# Altium footprint library Standard.PcbLib: 149 footprints (part 6 of 10)
Each footprint in its own frame and in the unit in brackets; x right, y up, seen from the top. Pads: shape width x height; smd on the part's side, far side on the other; paste and mask are expansions set on the pad; w line width, h text height; cw(c..) or ccw(c..) is an arc to the next point about the centre after c.
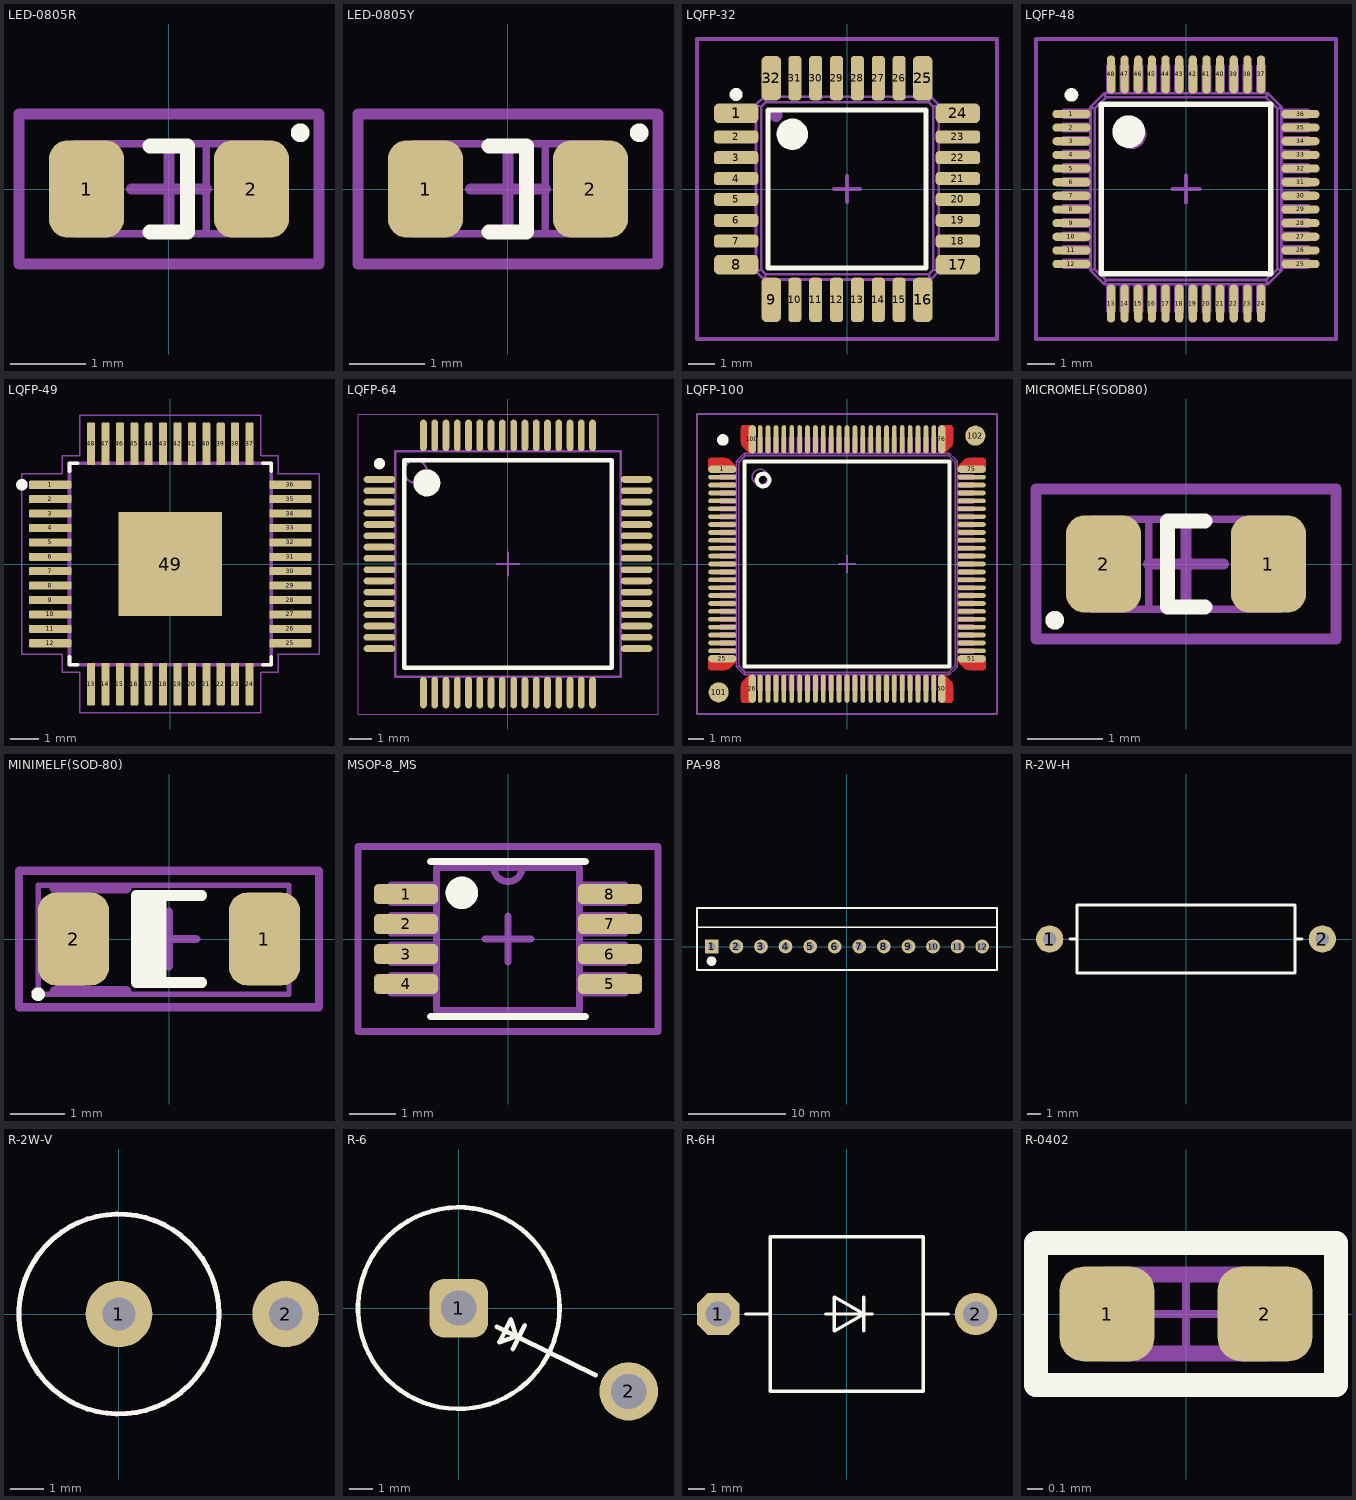
[diagram p5: the footprints below, top view; thin cyan lines are the x and y axes]

## LED-0805R [mm] "Chip Led, 2-Leads, Body 2,00x1,25mm, IPC Medium Density"
height 0.7
pads (2):
  rrect50% 1x1.3 smd: 1(-1.1,0) 2(1.1,0)
Top Overlay:
  circle w0.15: c1.75,0.75 r0.05
  lines w0.2: -0.25,-0.575 0.25,-0.575 0.25,0.575 -0.25,0.575
Top Assembly:
  lines w0.1: 0.5,-0.6 0.5,0.6 ; 0.75,-0.6 0.75,0.6 ; -1.25,-0.6 1.25,-0.6 1.25,0.6 -1.25,0.6 -1.25,-0.6
Top Component Outline:
  lines w0.15: -0.5,0 0.5,0 ; 0,-0.5 0,0.5 ; -2,-1 2,-1 2,1 -2,1 -2,-1
3D body "User Library-led_0805R.STEP": height 1.1, standoff 0, extent -1.01,-0.625 1.01,0.625

## LED-0805Y [mm] "Chip Led, 2-Leads, Body 2,00x1,25mm, IPC Medium Density"
height 0.7
pads (2):
  rrect50% 1x1.3 smd: 1(-1.1,0) 2(1.1,0)
Top Overlay:
  circle w0.15: c1.75,0.75 r0.05
  lines w0.2: -0.25,-0.575 0.25,-0.575 0.25,0.575 -0.25,0.575
Top Assembly:
  lines w0.1: 0.5,-0.6 0.5,0.6 ; 0.75,-0.6 0.75,0.6 ; -1.25,-0.6 1.25,-0.6 1.25,0.6 -1.25,0.6 -1.25,-0.6
Top Component Outline:
  lines w0.15: -0.5,0 0.5,0 ; 0,-0.5 0,0.5 ; -2,-1 2,-1 2,1 -2,1 -2,-1
3D body "User Library-led_0805Y.STEP": height 1.1, standoff 0, extent -1.01,-0.625 1.01,0.625

## LQFP-32 [mm] "LQFP, 32-Leads, Body 7,00x7,00mm, Pitch 0,80mm, IPC Medium Density"
height 1.2
pads (32):
  rrect50% 1.7x0.75 smd: 1(-4.25,2.9) 8(-4.25,-2.9) 17(4.25,-2.9) 24(4.25,2.9)
  rrect50% 1.7x0.5 smd: 2(-4.25,2) 3(-4.25,1.2) 4(-4.25,0.4) 5(-4.25,-0.4) 6(-4.25,-1.2) 7(-4.25,-2) 18(4.25,-2) 19(4.25,-1.2) 20(4.25,-0.4) 21(4.25,0.4) 22(4.25,1.2) 23(4.25,2)
  rrect50% 0.75x1.7 smd: 9(-2.9,-4.25) 16(2.9,-4.25) 25(2.9,4.25) 32(-2.9,4.25)
  rrect50% 0.5x1.7 smd: 10(-2,-4.25) 11(-1.2,-4.25) 12(-0.4,-4.25) 13(0.4,-4.25) 14(1.2,-4.25) 15(2,-4.25) 26(2,4.25) 27(1.2,4.25) 28(0.4,4.25) 29(-0.4,4.25) 30(-1.2,4.25) 31(-2,4.25)
Top Overlay:
  circle w0.6: c-2.1,2.1 r0.3
  circle w0.25: c-4.25,3.625 r0.125
  lines w0.2: -3.025,-3.025 -3.025,3.025 3.025,3.025 3.025,-3.025 -3.025,-3.025
Top Assembly:
  drawing of 313 lines, arcs and shapes, not listed
Top Component Outline:
  lines w0.15: -0.5,0 0.5,0 ; 0,-0.5 0,0.5 ; -5.75,-5.75 -5.75,5.75 5.75,5.75 5.75,-5.75 -5.75,-5.75
3D body "User Library-lqfp32-1.step": height 1.5, standoff 0.02, extent -4.5,-4.5 4.5,4.5

## LQFP-48 [mm] "SQFP, 48-Leads, Body 7,00x7,00mm, Pitch 0,50mm, IPC Medium Density"
height 1.8
pads (48):
  oval 1.4x0.3 smd: 1(-4.2,2.75) 2(-4.2,2.25) 3(-4.2,1.75) 4(-4.2,1.25) 5(-4.2,0.75) 6(-4.2,0.25) 7(-4.2,-0.25) 8(-4.2,-0.75) 9(-4.2,-1.25) 10(-4.2,-1.75) 11(-4.2,-2.25) 12(-4.2,-2.75) 25(4.2,-2.75) 26(4.2,-2.25) 27(4.2,-1.75) 28(4.2,-1.25) 29(4.2,-0.75) 30(4.2,-0.25) 31(4.2,0.25) 32(4.2,0.75) 33(4.2,1.25) 34(4.2,1.75) 35(4.2,2.25) 36(4.2,2.75)
  oval 0.3x1.4 smd: 13(-2.75,-4.2) 14(-2.25,-4.2) 15(-1.75,-4.2) 16(-1.25,-4.2) 17(-0.75,-4.2) 18(-0.25,-4.2) 19(0.25,-4.2) 20(0.75,-4.2) 21(1.25,-4.2) 22(1.75,-4.2) 23(2.25,-4.2) 24(2.75,-4.2) 37(2.75,4.2) 38(2.25,4.2) 39(1.75,4.2) 40(1.25,4.2) 41(0.75,4.2) 42(0.25,4.2) 43(-0.25,4.2) 44(-0.75,4.2) 45(-1.25,4.2) 46(-1.75,4.2) 47(-2.25,4.2) 48(-2.75,4.2)
Top Overlay:
  circle w0.6: c-2.1,2.1 r0.3
  circle w0.25: c-4.2,3.45 r0.125
  lines w0.2: -3.1,-3.1 3.1,-3.1 3.1,3.1 -3.1,3.1 -3.1,-3.1
Top Assembly:
  drawing of 1945 lines, arcs and shapes, not listed
Top Component Outline:
  lines w0.15: -0.5,0 0.5,0 ; 0,-0.5 0,0.5 ; -5.5,-5.5 -5.5,5.5 5.5,5.5 5.5,-5.5 -5.5,-5.5
3D body "User Library-LQFP48_Grid_0_5.STEP": height 1.6, standoff 0, extent -4.5,-4.5 4.5,4.5

## LQFP-49 [mm]
pads (49):
  rrect25% 1.47x0.28 smd: 1(-4.17,2.75) 2(-4.17,2.25) 3(-4.17,1.75) 4(-4.17,1.25) 5(-4.17,0.75) 6(-4.17,0.25) 7(-4.17,-0.25) 8(-4.17,-0.75) 9(-4.17,-1.25) 10(-4.17,-1.75) 11(-4.17,-2.25) 12(-4.17,-2.75) 25(4.17,-2.75) 26(4.17,-2.25) 27(4.17,-1.75) 28(4.17,-1.25) 29(4.17,-0.75) 30(4.17,-0.25) 31(4.17,0.25) 32(4.17,0.75) 33(4.17,1.25) 34(4.17,1.75) 35(4.17,2.25) 36(4.17,2.75)
  rrect25% 0.28x1.47 smd: 13(-2.75,-4.17) 14(-2.25,-4.17) 15(-1.75,-4.17) 16(-1.25,-4.17) 17(-0.75,-4.17) 18(-0.25,-4.17) 19(0.25,-4.17) 20(0.75,-4.17) 21(1.25,-4.17) 22(1.75,-4.17) 23(2.25,-4.17) 24(2.75,-4.17) 37(2.75,4.17) 38(2.25,4.17) 39(1.75,4.17) 40(1.25,4.17) 41(0.75,4.17) 42(0.25,4.17) 43(-0.25,4.17) 44(-0.75,4.17) 45(-1.25,4.17) 46(-1.75,4.17) 47(-2.25,4.17) 48(-2.75,4.17)
  rect 3.6x3.6 smd paste-3: 49(0,0)
Top Overlay:
  circle w0.2: c-5.152,2.75 r0.1
  lines w0.127: -3.5,-3.215 -3.5,-3.5 -3.215,-3.5 ; -3.5,3.215 -3.5,3.5 -3.215,3.5 ; 3.215,-3.5 3.5,-3.5 3.5,-3.215 ; 3.215,3.5 3.5,3.5 3.5,3.215
Top Paste:
  region: 1.445,-1.446 0.175,-1.446 0.175,-0.175 1.445,-0.175
  region: 1.445,0.175 0.175,0.175 0.175,1.445 1.445,1.445
  region: -0.175,0.175 -1.447,0.175 -1.447,1.445 -0.175,1.445
  region: -0.175,-1.447 -1.447,-1.447 -1.447,-0.175 -0.175,-0.175
Top Assembly:
  lines w0.127: -3.5,-3.5 3.5,-3.5 3.5,3.5 -3.5,3.5 -3.5,-3.5
Top Component Outline:
  lines w0.05: -5.16,-3.14 -5.16,3.14 -3.75,3.14 -3.75,3.75 -3.14,3.75 -3.14,5.16 3.14,5.16 3.14,3.75 3.75,3.75 3.75,3.14 5.16,3.14 5.16,-3.14 3.75,-3.14 3.75,-3.75 3.14,-3.75 3.14,-5.16 -3.14,-5.16 -3.14,-3.75 -3.75,-3.75 -3.75,-3.14 -5.16,-3.14
3D body "User Library-LQFP48_Grid_0_5.STEP": height 1.6, standoff 0, extent -4.5,-4.5 4.5,4.5

## LQFP-64 [mm] "SQFP, 64-Leads, Body 10,00x10,00mm, Pitch 0,50mm, IPC Medium Density"
height 2.45
pads (64):
  oval 1.4x0.3 smd: 1(-5.7,3.75) 2(-5.7,3.25) 3(-5.7,2.75) 4(-5.7,2.25) 5(-5.7,1.75) 6(-5.7,1.25) 7(-5.7,0.75) 8(-5.7,0.25) 9(-5.7,-0.25) 10(-5.7,-0.75) 11(-5.7,-1.25) 12(-5.7,-1.75) 13(-5.7,-2.25) 14(-5.7,-2.75) 15(-5.7,-3.25) 16(-5.7,-3.75) 33(5.7,-3.75) 34(5.7,-3.25) 35(5.7,-2.75) 36(5.7,-2.25) 37(5.7,-1.75) 38(5.7,-1.25) 39(5.7,-0.75) 40(5.7,-0.25) 41(5.7,0.25) 42(5.7,0.75) 43(5.7,1.25) 44(5.7,1.75) 45(5.7,2.25) 46(5.7,2.75) 47(5.7,3.25) 48(5.7,3.75)
  oval 0.3x1.4 smd: 17(-3.75,-5.7) 18(-3.25,-5.7) 19(-2.75,-5.7) 20(-2.25,-5.7) 21(-1.75,-5.7) 22(-1.25,-5.7) 23(-0.75,-5.7) 24(-0.25,-5.7) 25(0.25,-5.7) 26(0.75,-5.7) 27(1.25,-5.7) 28(1.75,-5.7) 29(2.25,-5.7) 30(2.75,-5.7) 31(3.25,-5.7) 32(3.75,-5.7) 49(3.75,5.7) 50(3.25,5.7) 51(2.75,5.7) 52(2.25,5.7) 53(1.75,5.7) 54(1.25,5.7) 55(0.75,5.7) 56(0.25,5.7) 57(-0.25,5.7) 58(-0.75,5.7) 59(-1.25,5.7) 60(-1.75,5.7) 61(-2.25,5.7) 62(-2.75,5.7) 63(-3.25,5.7) 64(-3.75,5.7)
Top Overlay:
  circle w0.6: c-3.6,3.6 r0.3
  circle w0.25: c-5.7,4.45 r0.125
  lines w0.2: -4.6,-4.6 4.6,-4.6 4.6,4.6 -4.6,4.6 -4.6,-4.6
Top Assembly:
  circle w0.1: c-4.1,4.1 r0.5
  lines w0.1: -5,-5 5,-5 5,5 -5,5 -5,-5
Top Component Outline:
  lines w0.05: -6.65,-6.65 6.65,-6.65 6.65,6.65 -6.65,6.65 -6.65,-6.65
  lines w0.1: -0.5,0 0.5,0 ; 0,-0.5 0,0.5
3D body "SQFP50P1200X1200X245-64N.step": height 2.45, standoff 0, extent -6,-6 6,6

## LQFP-100 [mm]
pads (110):
  oval 1.78x0.5 smd: 1(-7.9,6) 25(-7.9,-6) 51(7.9,-6) 75(7.9,6)
  round 0 smd paste-25.4 mask-25.4: 1(-7.9,6) 25(-7.9,-6) 26(-6,-7.9) 50(6,-7.9) 51(7.9,-6) 75(7.9,6) 76(6,7.9) 100(-6,7.9)
  oval 1.78x0.3 smd: 2(-7.9,5.5) 3(-7.9,5) 4(-7.9,4.5) 5(-7.9,4) 6(-7.9,3.5) 7(-7.9,3) 8(-7.9,2.5) 9(-7.9,2) 10(-7.9,1.5) 11(-7.9,1) 12(-7.9,0.5) 13(-7.9,0) 14(-7.9,-0.5) 15(-7.9,-1) 16(-7.9,-1.5) 17(-7.9,-2) 18(-7.9,-2.5) 19(-7.9,-3) 20(-7.9,-3.5) 21(-7.9,-4) 22(-7.9,-4.5) 23(-7.9,-5) 24(-7.9,-5.5) 52(7.9,-5.5) 53(7.9,-5) 54(7.9,-4.5) 55(7.9,-4) 56(7.9,-3.5) 57(7.9,-3) 58(7.9,-2.5) 59(7.9,-2) 60(7.9,-1.5) 61(7.9,-1) 62(7.9,-0.5) 63(7.9,0) 64(7.9,0.5) 65(7.9,1) 66(7.9,1.5) 67(7.9,2) 68(7.9,2.5) 69(7.9,3) 70(7.9,3.5) 71(7.9,4) 72(7.9,4.5) 73(7.9,5) 74(7.9,5.5)
  oval 0.5x1.78 smd: 26(-6,-7.9) 50(6,-7.9) 76(6,7.9) 100(-6,7.9)
  oval 0.3x1.78 smd: 27(-5.5,-7.9) 28(-5,-7.9) 29(-4.5,-7.9) 30(-4,-7.9) 31(-3.5,-7.9) 32(-3,-7.9) 33(-2.5,-7.9) 34(-2,-7.9) 35(-1.5,-7.9) 36(-1,-7.9) 37(-0.5,-7.9) 38(0,-7.9) 39(0.5,-7.9) 40(1,-7.9) 41(1.5,-7.9) 42(2,-7.9) 43(2.5,-7.9) 44(3,-7.9) 45(3.5,-7.9) 46(4,-7.9) 47(4.5,-7.9) 48(5,-7.9) 49(5.5,-7.9) 77(5.5,7.9) 78(5,7.9) 79(4.5,7.9) 80(4,7.9) 81(3.5,7.9) 82(3,7.9) 83(2.5,7.9) 84(2,7.9) 85(1.5,7.9) 86(1,7.9) 87(0.5,7.9) 88(0,7.9) 89(-0.5,7.9) 90(-1,7.9) 91(-1.5,7.9) 92(-2,7.9) 93(-2.5,7.9) 94(-3,7.9) 95(-3.5,7.9) 96(-4,7.9) 97(-4.5,7.9) 98(-5,7.9) 99(-5.5,7.9)
  round 1.27 smd mask-25.4: 101(-8.128,-8.128) 102(8.128,8.128)
Top Layer:
  region: -7.01,-6.137 -7.021,-6.191 -7.051,-6.236 -7.389,-6.574 -7.492,-6.653 -7.613,-6.703 -7.742,-6.72 -8.642,-6.72 -8.699,-6.709 -8.747,-6.677 -8.779,-6.629 -8.79,-6.573 -8.79,-6.008 -7.01,-6
  region: -7.01,6.137 -7.021,6.191 -7.051,6.236 -7.389,6.574 -7.492,6.653 -7.613,6.703 -7.742,6.72 -8.642,6.72 -8.699,6.709 -8.747,6.677 -8.779,6.629 -8.79,6.573 -8.79,6.008 -7.01,6
  region: -6.137,7.01 -6.191,7.021 -6.236,7.051 -6.574,7.389 -6.653,7.492 -6.703,7.613 -6.72,7.742 -6.72,8.642 -6.709,8.699 -6.677,8.747 -6.629,8.779 -6.573,8.79 -6.008,8.79 -6,7.01
  region: 6.137,7.01 6.191,7.021 6.236,7.051 6.574,7.389 6.653,7.492 6.703,7.613 6.72,7.742 6.72,8.642 6.709,8.699 6.677,8.747 6.629,8.779 6.573,8.79 6.008,8.79 6,7.01
  region: 7.01,6.137 7.021,6.191 7.051,6.236 7.389,6.574 7.492,6.653 7.613,6.703 7.742,6.72 8.643,6.72 8.699,6.709 8.747,6.677 8.779,6.629 8.79,6.573 8.79,6.008 7.01,6
  region: 7.01,-6.137 7.021,-6.191 7.051,-6.236 7.389,-6.574 7.492,-6.653 7.613,-6.703 7.742,-6.72 8.643,-6.72 8.699,-6.709 8.747,-6.677 8.779,-6.629 8.79,-6.573 8.79,-6.008 7.01,-6
  region: 6.137,-7.01 6.191,-7.021 6.236,-7.051 6.574,-7.389 6.653,-7.492 6.703,-7.613 6.72,-7.742 6.72,-8.642 6.709,-8.699 6.677,-8.747 6.629,-8.779 6.573,-8.79 6.008,-8.79 6,-7.01
  region: -6.137,-7.01 -6.191,-7.021 -6.236,-7.051 -6.574,-7.389 -6.653,-7.492 -6.703,-7.613 -6.72,-7.742 -6.72,-8.642 -6.709,-8.699 -6.677,-8.747 -6.629,-8.779 -6.573,-8.79 -6.008,-8.79 -6,-7.01
Top Overlay:
  circle w0.254: c-5.318,5.318 r0.4
  circle w0.4: c-7.858,7.858 r0.168
  lines w0.254: -6.477,-6.477 -6.477,6.477 6.477,6.477 6.477,-6.477 -6.477,-6.477
Top Solder:
  region: -8.128,-6.847 -8.46,-6.891 -8.768,-7.019 -9.034,-7.222 -9.237,-7.488 -9.365,-7.796 -9.409,-8.128 -9.365,-8.46 -9.237,-8.768 -9.034,-9.034 -8.768,-9.237 -8.46,-9.365 -8.128,-9.409 -7.796,-9.365 -7.488,-9.237 -7.222,-9.034 -7.019,-8.768 -6.891,-8.46 -6.847,-8.128 -6.891,-7.796 -7.019,-7.488 -7.222,-7.222 -7.488,-7.019 -7.796,-6.891
  region: 8.128,9.409 7.796,9.365 7.488,9.237 7.222,9.034 7.019,8.768 6.891,8.46 6.847,8.128 6.891,7.796 7.019,7.488 7.222,7.222 7.488,7.019 7.796,6.891 8.128,6.847 8.46,6.891 8.768,7.019 9.034,7.222 9.237,7.488 9.365,7.796 9.409,8.128 9.365,8.46 9.237,8.768 9.034,9.034 8.768,9.237 8.46,9.365
Top Assembly:
  drawing of 4025 lines, arcs and shapes, not listed
Top Component Outline:
  lines w0.15: -0.5,0 0.5,0 ; 0,-0.5 0,0.5 ; -9.5,-9.5 9.5,-9.5 9.5,9.5 -9.5,9.5 -9.5,-9.5
3D body "User Library-LQFP100_Grid_0_5.STEP": height 1.6, standoff 0, extent -8,-8 8,8

## MICROMELF(SOD80) [mm] "MELF Diode, 2-Leads, Body 1,90x1,15mm, IPC Medium Density"
height 1.2
pads (2):
  rrect50% 1x1.3 smd: 1(1.1,0) 2(-1.1,0)
Top Overlay:
  circle w0.15: c-1.75,-0.75 r0.05
  lines w0.2: 0.25,-0.575 -0.25,-0.575 -0.25,0.575 0.25,0.575
Top Assembly:
  lines w0.1: -0.75,-0.6 -0.75,0.6 ; -0.5,-0.6 -0.5,0.6 ; -1.25,-0.6 -1.25,0.6 1.25,0.6 1.25,-0.6 -1.25,-0.6
Top Component Outline:
  lines w0.15: -0.5,0 0.5,0 ; 0,-0.5 0,0.5 ; -2,-1 -2,1 2,1 2,-1 -2,-1
3D body "DIOMELF1912N.step": height 1.15, standoff 0, extent -0.95,-0.574 0.95,0.574

## MINIMELF(SOD-80) [mm] "SOD-80, MELF Diode, 2-Leads, Body 3,50x1,45mm, IPC Medium Density"
height 1.6
pads (2):
  rrect50% 1.3x1.7 smd: 1(1.75,0) 2(-1.75,0)
Top Overlay:
  circle w0.15: c-2.4,-1.011 r0.05
  region: -0.05,0.8 -0.6,0.8 -0.6,-0.8 -0.05,-0.8
  lines w0.2: 0.6,-0.8 -0.6,-0.8 -0.6,0.8 0.6,0.8
Top Assembly:
  region: -1.538,0.839 -2.088,0.839 -2.088,-0.961 -1.538,-0.961
  lines w0.1: -2.4,-1.011 2.2,-1.011 2.2,0.989 -2.4,0.989 -2.4,-1.011
  lines w0.2: -2.088,-0.961 -0.788,-0.961 ; -2.088,0.939 -0.788,0.939
Top Component Outline:
  lines w0.15: -0.5,0 0.5,0 ; 0,-0.5 0,0.5 ; -2.75,-1.25 2.75,-1.25 2.75,1.25 -2.75,1.25 -2.75,-1.25
3D body "Minimelf.step": height 1.4, standoff 0, extent -1.75,-0.689 1.75,0.711

## MSOP-8_MS [mil]
pads (8):
  rrect50% 55x17 smd: 1(-87,38.39) 2(-87,12.8) 3(-87,-12.8) 4(-87,-38.39) 5(87,-38.39) 6(87,-12.8) 7(87,12.8) 8(87,38.39)
Top Overlay:
  circle w23.62: c-39.37,39.37 r1.97
  lines w6: -66,-66 66,-66 ; -66,66 66,66
Top Assembly:
  circle w3.94: c-39.37,39.37 r11.81
  lines w6: -61,5 -100,5 -100,20 -61,20 ; -61,31 -100,31 -100,46 -61,46 ; -12,61 ccw(c0,61) 12,61 ; -12,61 12,61 ; -12,61 -61,61 -61,-61 61,-61 61,61 12,61 ; -100,-46 -100,-31 -61,-31 -61,-46 -100,-46 ; -100,-20 -100,-5 -61,-5 -61,-20 -100,-20 ; 61,-46 61,-31 100,-31 100,-46 61,-46 ; 61,-20 61,-5 100,-5 100,-20 61,-20 ; 61,5 61,20 100,20 100,5 61,5 ; 61,31 61,46 100,46 100,31 61,31
Top Component Outline:
  lines w5.91: -19.69,0 19.68,0 ; 0,-19.68 0,19.69 ; -127.95,-78.74 127.95,-78.74 127.95,78.74 -127.95,78.74 -127.95,-78.74
3D body "step_temp.STEP": height 43.46, standoff 0.15, extent -96.46,-59.05 96.45,59.06

## PA-98 [mil]
pads (12):
  rect 56x56 hole 31.5: 1(-550,0)
  round 56 hole 31.5: 2(-450,0) 3(-350,0) 4(-250,0) 5(-150,0) 6(-50,0) 7(50,0) 8(150,0) 9(250,0) 10(350,0) 11(450,0) 12(550,0)
Top Overlay:
  circle w7.87: c-555.12,-59.45 r5.57
  circle w7.87: c-547.24,-59.45 r7.87
  circle w7.87: c-551.18,-59.45 r8.8
  circle w7.87: c-551.18,-59.45 r15.75
  lines w8: 610.24,78.35 -610.24,78.35 ; -610.24,78.35 -610.24,-96.06 610.24,-96.06 610.24,157.09 -610.24,157.09 -610.24,78.35
3D body "User Library-PA92 (SIP-12).STEP": height 916.26, standoff -236.32, extent -610.24,-96.06 610.24,157.09

## R-2W-H [mm] "Резистор 2W горизоньальный"
pads (2):
  round 2 hole 1: 1(-10,0) 2(10,0)
Top Overlay:
  lines w0.2: -8.5,0 -8,0 ; 8,0 8.5,0 ; -8,-2.5 8,-2.5 8,2.5 -8,2.5 -8,-2.5
Top Assembly:
  lines w0.1: -8.5,0 -8,0 ; 8,0 8.5,0 ; -8,-2.5 -8,2.5 8,2.5 8,-2.5 -8,-2.5
3D body "RESAD2000W80L1600D500_2W.STEP": height 5, standoff -3, extent -10.4,-2.5 10.4,2.5

## R-2W-V [mm] "Резистор 2W вертикальный"
pads (2):
  round 2 hole 1: 1(0,0) 2(5,0)
Top Overlay:
  circle w0.15: c0,0 r3
Top Assembly:
  circle w0.15: c0,0 r3
3D body "RESAD500W80L1600D500_2W.STEP": height 20.19, standoff -3.21, extent -2.5,-2.5 5.4,2.5

## R-6 [mm] "R-6 diode case"
pads (2):
  rrect50% 2.5x2.5 hole 1.5: 1(0,0)
  round 2.5 hole 1.5: 2(7.25,-3.55)
Top Overlay:
  circle w0.2: c0,0 r4.3
  lines w0.2: 1.617,-0.792 5.845,-2.862 ; 2.304,-1.743 2.816,-0.738 ; 1.739,-1.447 1.971,-0.983 2.221,-0.482 2.462,-1.206 1.739,-1.447
Top Assembly:
  circle w0.1: c0,0 r4.3
  lines w0.1: 1.617,-0.792 5.845,-2.862 ; 2.304,-1.743 2.816,-0.738 ; 1.739,-1.447 1.971,-0.983 2.221,-0.482 2.462,-1.206 1.739,-1.447
3D body "V-Diode P5.STEP": height 11.76, standoff -1.84, extent -4.279,-4.3 7.779,4.3

## R-6H [mm] "R-6 diode case"
pads (2):
  oct 2.5x2.5 hole 1.5: 1(-7.62,0)
  round 2.5 hole 1.5: 2(7.62,0)
Top Overlay:
  lines w0.2: -6,0 -4.547,0 ; -1.25,0 -0.5,0 1.5,0 ; 1,-1 1,1 ; 4.547,0 6,0 ; -4.547,-4.572 -4.547,4.572 4.5,4.572 4.5,-4.572 -4.547,-4.572 ; -0.75,-1 1,0 -0.75,1 -0.75,0.75 -0.75,-1
Top Assembly:
  lines w0.1: -6,0 -4.547,0 ; -1.25,0 -0.5,0 1.5,0 ; 1,-1 1,1 ; 4.547,0 6,0 ; -4.547,-4.572 -4.547,4.572 4.5,4.572 4.5,-4.572 -4.547,-4.572 ; -0.75,-1 1,0 -0.75,1 -0.75,0.75 -0.75,-1
3D body "User Library-Diode R-6 diameter 9_1 pitch 600mils.STEP": height 9.16, standoff -5.55, extent -8.255,-4.56 8.285,4.56

## R-0402 [mm]
height 0.6
pads (2):
  rrect50% 0.6x0.6 smd: 1(-0.5,0) 2(0.5,0)
Top Overlay:
  lines w0.15: -0.95,-0.45 -0.95,0.45 0.95,0.45 0.95,-0.45 -0.95,-0.45
Top Assembly:
  lines w0.1: -0.5,-0.25 0.5,-0.25 0.5,0.25 -0.5,0.25 -0.5,-0.25
Top Component Outline:
  lines w0.05: -0.25,0 0.25,0 ; 0,-0.25 0,0.25
  lines w0.15: -0.95,-0.45 -0.95,0.45 ; -0.925,-0.45 0.9,-0.45 ; -0.925,0.45 0.9,0.45 ; 0.95,-0.45 0.95,0.45
3D body "User Library-R_0402.STEP": height 0.35, standoff 0, extent -0.5,-0.25 0.5,0.25